# Altium footprint library TranDangKhoa-LIB.PcbLib: 1435 footprints (part 76 of 90)
Each footprint in its own frame and in the unit in brackets; x right, y up, seen from the top. Pads: shape width x height; smd on the part's side, far side on the other; paste and mask are expansions set on the pad; w line width, h text height; cw(c..) or ccw(c..) is an arc to the next point about the centre after c.
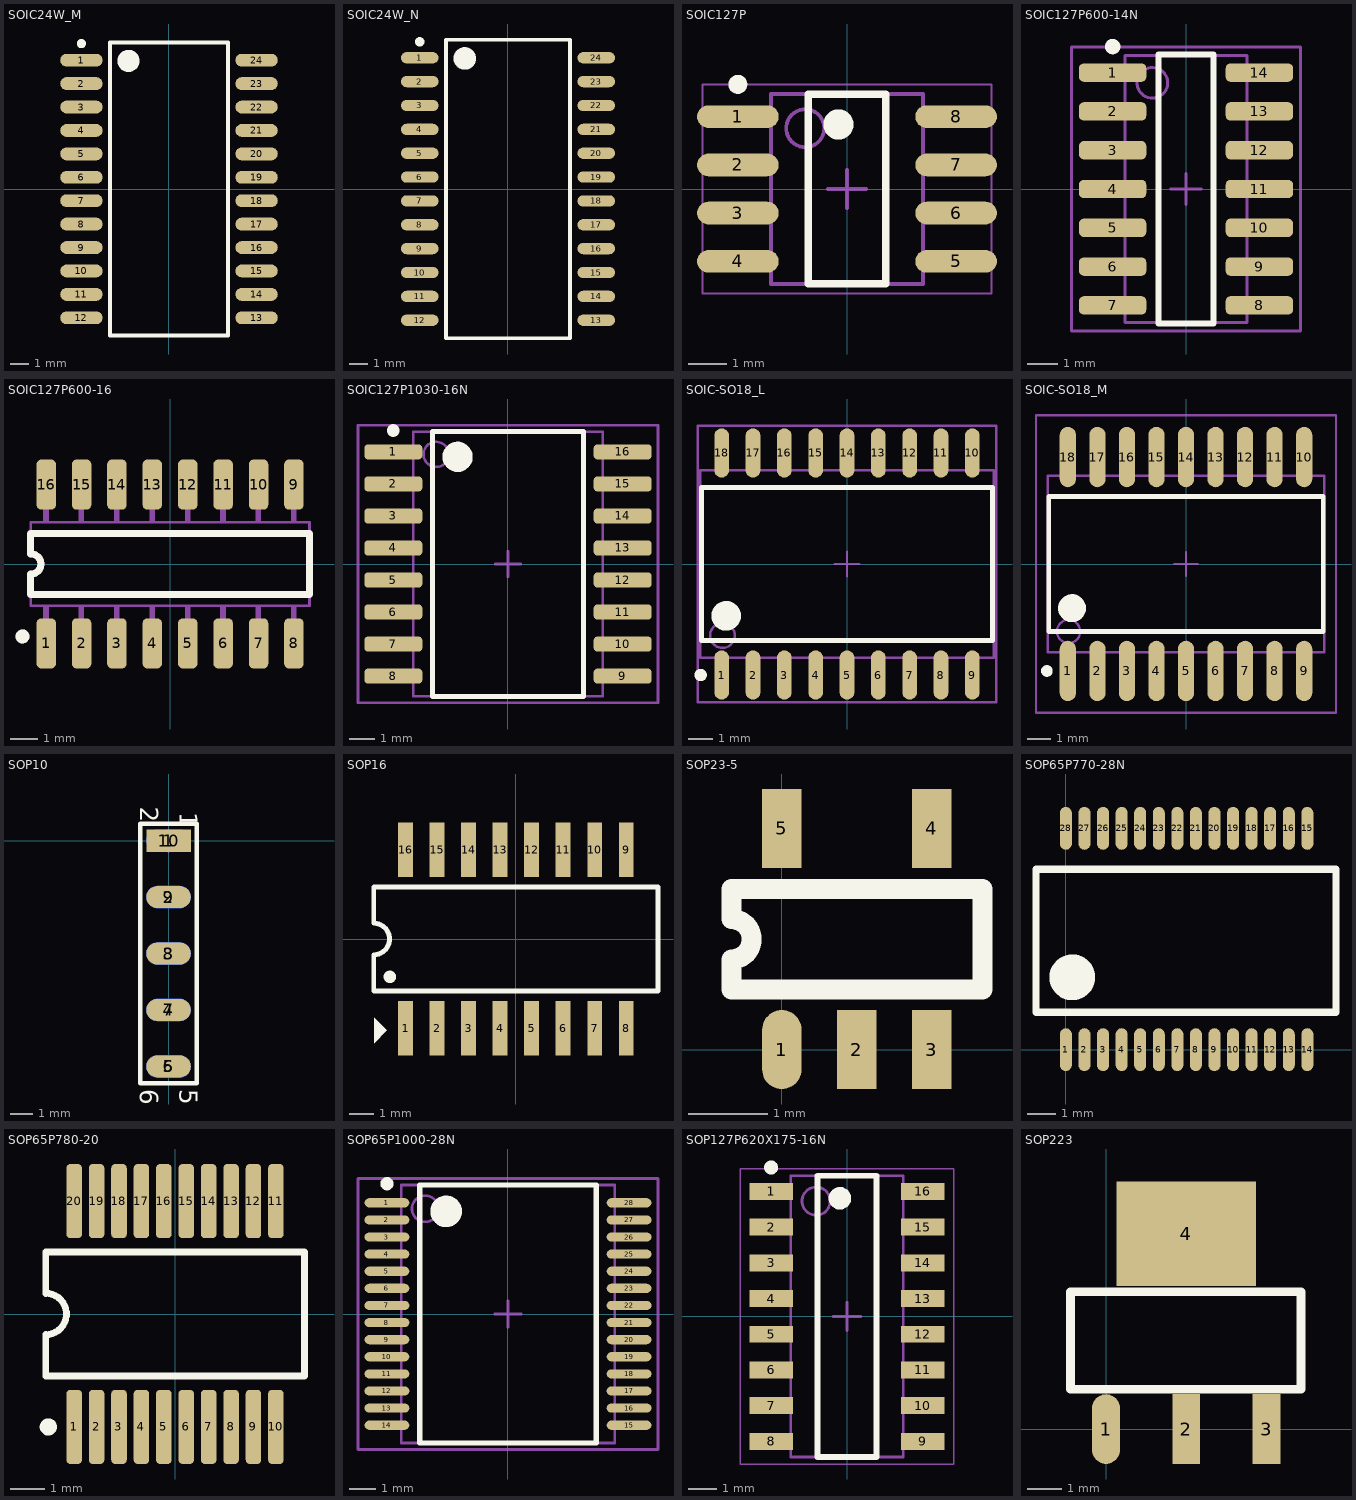
[diagram p75: the footprints below, top view; thin cyan lines are the x and y axes]

## SOIC24W_M [mm] "SOIC, 24-Leads, Body 15.4x7.5mm, Pitch 1.27mm, IPC Low Density"
height 2.67
pads (24):
  oval 2.3x0.7 smd: 1(-4.75,6.985) 2(-4.75,5.715) 3(-4.75,4.445) 4(-4.75,3.175) 5(-4.75,1.905) 6(-4.75,0.635) 7(-4.75,-0.635) 8(-4.75,-1.905) 9(-4.75,-3.175) 10(-4.75,-4.445) 11(-4.75,-5.715) 12(-4.75,-6.985) 13(4.75,-6.985) 14(4.75,-5.715) 15(4.75,-4.445) 16(4.75,-3.175) 17(4.75,-1.905) 18(4.75,-0.635) 19(4.75,0.635) 20(4.75,1.905) 21(4.75,3.175) 22(4.75,4.445) 23(4.75,5.715) 24(4.75,6.985)
Top Overlay:
  circle w0.6: c-2.2,6.95 r0.3
  circle w0.25: c-4.75,7.885 r0.125
  lines w0.2: -3.2,-7.95 3.2,-7.95 3.2,7.95 -3.2,7.95 -3.2,-7.95

## SOIC24W_N [mm] "SOIC, 24-Leads, Body 15.4x7.5mm, Pitch 1.27mm, IPC Medium Density"
height 2.67
pads (24):
  oval 2x0.6 smd: 1(-4.7,6.985) 2(-4.7,5.715) 3(-4.7,4.445) 4(-4.7,3.175) 5(-4.7,1.905) 6(-4.7,0.635) 7(-4.7,-0.635) 8(-4.7,-1.905) 9(-4.7,-3.175) 10(-4.7,-4.445) 11(-4.7,-5.715) 12(-4.7,-6.985) 13(4.7,-6.985) 14(4.7,-5.715) 15(4.7,-4.445) 16(4.7,-3.175) 17(4.7,-1.905) 18(4.7,-0.635) 19(4.7,0.635) 20(4.7,1.905) 21(4.7,3.175) 22(4.7,4.445) 23(4.7,5.715) 24(4.7,6.985)
Top Overlay:
  circle w0.25: c-4.7,7.835 r0.125
  circle w0.6: c-2.3,6.95 r0.3
  lines w0.2: -3.3,-7.95 -3.3,7.95 3.3,7.95 3.3,-7.95 -3.3,-7.95

## SOIC127P [mm] "SOIC, 8-Leads, Body 5.00x4.00mm, Pitch 1.27mm, IPC Medium Density"
height 1.7
pads (8):
  oval 2.15x0.6 smd: 1(-2.875,1.905) 2(-2.875,0.635) 3(-2.875,-0.635) 4(-2.875,-1.905) 5(2.875,-1.905) 6(2.875,-0.635) 7(2.875,0.635) 8(2.875,1.905)
Top Overlay:
  circle w0.4: c-0.225,1.7 r0.2
  circle w0.25: c-2.875,2.755 r0.125
  lines w0.2: -1.025,-2.5 1.025,-2.5 1.025,2.5 -1.025,2.5 -1.025,-2.5
Mechanical 13:
  circle w0.1: c-1.1,1.6 r0.5
  lines w0.1: -2,-2.5 2,-2.5 2,2.5 -2,2.5 -2,-2.5
Mechanical 15:
  lines w0.05: -3.8,-2.75 3.8,-2.75 3.8,2.75 -3.8,2.75 -3.8,-2.75
  lines w0.1: -0.5,0 0.5,0 ; 0,-0.5 0,0.5
3D body: height 1.7, standoff 1.7, extent -2,-2.5 2,2.5

## SOIC127P600-14N [mm]
pads (14):
  rrect50% 2.2x0.6 smd: 1(-2.4,3.81) 2(-2.4,2.54) 3(-2.4,1.27) 4(-2.4,0) 5(-2.4,-1.27) 6(-2.4,-2.54) 7(-2.4,-3.81) 8(2.4,-3.81) 9(2.4,-2.54) 10(2.4,-1.27) 11(2.4,0) 12(2.4,1.27) 13(2.4,2.54) 14(2.4,3.81)
Top Overlay:
  circle w0.25: c-2.4,4.66 r0.125
  lines w0.2: -0.9,-4.4 -0.9,4.4 0.9,4.4 0.9,-4.4 -0.9,-4.4
Mechanical 13:
  circle w0.1: c-1.1,3.475 r0.5
  lines w0.1: -2,-4.375 -2,4.375 2,4.375 2,-4.375 -2,-4.375
Mechanical 15:
  lines w0.1: -0.5,0 0.5,0 ; 0,-0.5 0,0.5 ; -3.75,-4.65 -3.75,4.65 3.75,4.65 3.75,-4.65 -3.75,-4.65
3D body "SW3dPS-SOIC14-150.STEP": height 1.75, standoff 0, extent -2.879,-4.275 2.921,4.275

## SOIC127P600-16 [mm]
pads (16):
  rrect50% 0.7x1.8 smd: 1(-4.445,-2.85) 2(-3.175,-2.85) 3(-1.905,-2.85) 4(-0.635,-2.85) 5(0.635,-2.85) 6(1.905,-2.85) 7(3.175,-2.85) 8(4.445,-2.85) 9(4.445,2.85) 10(3.175,2.85) 11(1.905,2.85) 12(0.635,2.85) 13(-0.635,2.85) 14(-1.905,2.85) 15(-3.175,2.85) 16(-4.445,2.85)
Top Overlay:
  circle w0.25: c-5.295,-2.6 r0.125
  lines w0.254: -5,-1.1 5,-1.1 5,1.1 -5,1.1 -5,0.367 cw(c-5,0) -5,-0.367 -5,-1.1
Mechanical 7:
  circle w0.25: c-5.295,-2.6 r0.125
  region: 4.34,-1.5 4.34,-2.8 4.54,-2.8 4.54,-1.5
  region: 3.07,-1.5 3.07,-2.8 3.27,-2.8 3.27,-1.5
  region: 1.8,-1.5 1.8,-2.8 2,-2.8 2,-1.5
  region: 0.53,-1.5 0.53,-2.8 0.73,-2.8 0.73,-1.5
  region: -0.74,-1.5 -0.74,-2.8 -0.54,-2.8 -0.54,-1.5
  region: -2.01,-1.5 -2.01,-2.8 -1.81,-2.8 -1.81,-1.5
  region: -3.28,-1.5 -3.28,-2.8 -3.08,-2.8 -3.08,-1.5
  region: -4.55,-1.5 -4.55,-2.8 -4.35,-2.8 -4.35,-1.5
  region: 4.54,1.5 4.54,2.8 4.34,2.8 4.34,1.5
  region: 3.27,1.5 3.27,2.8 3.07,2.8 3.07,1.5
  region: 2,1.5 2,2.8 1.8,2.8 1.8,1.5
  region: 0.73,1.5 0.73,2.8 0.53,2.8 0.53,1.5
  region: -0.54,1.5 -0.54,2.8 -0.74,2.8 -0.74,1.5
  region: -1.81,1.5 -1.81,2.8 -2.01,2.8 -2.01,1.5
  region: -3.08,1.5 -3.08,2.8 -3.28,2.8 -3.28,1.5
  region: -4.35,1.5 -4.35,2.8 -4.55,2.8 -4.55,1.5
  lines w0.1: -5,-0.367 -5,-1.5 5,-1.5 5,1.5 -5,1.5 -5,0.367
  lines w0.254: -5,-0.367 ccw(c-5,0) -5,0.367
  text ".Comment" at -4.8,-1.3 h0.8
  text ".Designator" at -4.8,0.8 h0.8
3D body "SW3dPS-SOIC16-150.STEP": height 1.75, standoff 0, extent -4.9,-2.875 4.9,2.925

## SOIC127P1030-16N [mm]
pads (16):
  rrect50% 2.3x0.6 smd: 1(-4.55,4.445) 2(-4.55,3.175) 3(-4.55,1.905) 4(-4.55,0.635) 5(-4.55,-0.635) 6(-4.55,-1.905) 7(-4.55,-3.175) 8(-4.55,-4.445) 9(4.55,-4.445) 10(4.55,-3.175) 11(4.55,-1.905) 12(4.55,-0.635) 13(4.55,0.635) 14(4.55,1.905) 15(4.55,3.175) 16(4.55,4.445)
Top Overlay:
  circle w0.6: c-2,4.25 r0.3
  circle w0.25: c-4.55,5.295 r0.125
  lines w0.2: -3,-5.25 3,-5.25 3,5.25 -3,5.25 -3,-5.25
Mechanical 13:
  circle w0.1: c-2.85,4.35 r0.5
  lines w0.1: -3.75,-5.25 3.75,-5.25 3.75,5.25 -3.75,5.25 -3.75,-5.25
Mechanical 15:
  lines w0.1: -0.5,0 0.5,0 ; 0,-0.5 0,0.5 ; -5.95,-5.5 5.95,-5.5 5.95,5.5 -5.95,5.5 -5.95,-5.5
3D body: height 0.2, standoff 0, extent 2.978,-0.905 4.851,-0.296
3D body: height 0.2, standoff 0, extent 2.959,-2.182 4.851,-1.573
3D body: height 0.2, standoff 0, extent 2.998,-3.477 4.851,-2.868
3D body: height 0.2, standoff 0, extent 3.025,-4.734 4.895,-4.164
3D body: height 0.2, standoff 0, extent 2.934,4.172 4.807,4.781
3D body: height 0.2, standoff 0, extent 2.915,2.895 4.807,3.504
3D body: height 0.2, standoff 0, extent 2.954,1.6 4.807,2.209
3D body: height 0.2, standoff 0, extent 2.981,0.343 4.851,0.913
3D body: height 0.2, standoff 0, extent -4.859,0.305 -2.987,0.914
3D body: height 0.2, standoff 0, extent -4.859,1.582 -2.968,2.191
3D body: height 0.2, standoff 0, extent -4.859,2.877 -3.007,3.486
3D body: height 0.2, standoff 0, extent -4.903,4.173 -3.034,4.743
3D body: height 0.2, standoff 0, extent -4.851,-0.917 -2.982,-0.347
3D body: height 0.2, standoff 0, extent -4.807,-2.213 -2.955,-1.604
3D body: height 0.2, standoff 0, extent -4.807,-3.508 -2.916,-2.899
3D body: height 0.2, standoff 0, extent -4.807,-4.785 -2.935,-4.176
3D body: height 2.65, standoff 0, extent -3.75,-5.25 3.75,5.25

## SOIC-SO18_L [mm] "SOIC, 18-Leads, Body 11.5x7.5mm, Pitch 1.27mm, IPC High Density"
height 2.65
pads (18):
  oval 0.6x2 smd: 1(-5.08,-4.5) 2(-3.81,-4.5) 3(-2.54,-4.5) 4(-1.27,-4.5) 5(0,-4.5) 6(1.27,-4.5) 7(2.54,-4.5) 8(3.81,-4.5) 9(5.08,-4.5) 10(5.08,4.5) 11(3.81,4.5) 12(2.54,4.5) 13(1.27,4.5) 14(0,4.5) 15(-1.27,4.5) 16(-2.54,4.5) 17(-3.81,4.5) 18(-5.08,4.5)
Top Overlay:
  circle w0.25: c-5.93,-4.5 r0.125
  circle w0.6: c-4.9,-2.1 r0.3
  lines w0.2: -5.9,-3.1 5.9,-3.1 5.9,3.1 -5.9,3.1 -5.9,-3.1
Mechanical 13:
  circle w0.1: c-5.05,-2.9 r0.5
  lines w0.1: -5.95,-3.8 5.95,-3.8 5.95,3.8 -5.95,3.8 -5.95,-3.8
Mechanical 15:
  lines w0.1: -0.5,0 0.5,0 ; 0,-0.5 0,0.5 ; -6.05,-5.6 6.05,-5.6 6.05,5.6 -6.05,5.6 -6.05,-5.6
3D body "PIC16F819-I-SOIC18.step": height 2.52, standoff 0.01, extent -5.765,-5.133 5.765,5.207

## SOIC-SO18_M [mm] "SOIC, 18-Leads, Body 11.5x7.5mm, Pitch 1.27mm, IPC Low Density"
height 2.65
pads (18):
  oval 0.7x2.6 smd: 1(-5.08,-4.6) 2(-3.81,-4.6) 3(-2.54,-4.6) 4(-1.27,-4.6) 5(0,-4.6) 6(1.27,-4.6) 7(2.54,-4.6) 8(3.81,-4.6) 9(5.08,-4.6) 10(5.08,4.6) 11(3.81,4.6) 12(2.54,4.6) 13(1.27,4.6) 14(0,4.6) 15(-1.27,4.6) 16(-2.54,4.6) 17(-3.81,4.6) 18(-5.08,4.6)
Top Overlay:
  circle w0.25: c-5.98,-4.6 r0.125
  circle w0.6: c-4.9,-1.9 r0.3
  lines w0.2: -5.9,-2.9 5.9,-2.9 5.9,2.9 -5.9,2.9 -5.9,-2.9
Mechanical 13:
  circle w0.1: c-5.05,-2.9 r0.5
  lines w0.1: -5.95,-3.8 5.95,-3.8 5.95,3.8 -5.95,3.8 -5.95,-3.8
Mechanical 15:
  lines w0.1: -0.5,0 0.5,0 ; 0,-0.5 0,0.5 ; -6.45,-6.4 6.45,-6.4 6.45,6.4 -6.45,6.4 -6.45,-6.4
3D body "PIC16F819-I-SOIC18.step": height 2.52, standoff 0.01, extent -5.765,-5.133 5.765,5.207

## SOP10 [mm] "SOIC 10 hai lop"
height 2.54
pads (10):
  rect 2x1 smd: 1(0,0)
  oval 2x1 smd: 2(0,-2.54) 3(0,-5.08) 4(0,-7.62) 5(0,-10.16)
  oval 2x1 smd far side: 6(0,-10.16) 7(0,-7.62) 8(0,-5.08) 9(0,-2.54) 10(0,0)
Top Overlay:
  lines w0.2: -1.27,0 -1.27,0.762 1.27,0.762 1.27,0 ; -1.27,0.086 -1.27,-10.414 -1.27,-10.922 1.27,-10.922 1.27,-10.414 1.27,0.086
  text "6" at -1.27,-11.176 h0.8
  text "5" at 0.508,-11.176 h0.8
  text "2" at -1.27,1.524 h0.8
  text "1" at 0.508,1.27 h0.8
Mechanical 15:
  lines w0.1: -0.5,0 0.5,0 ; 0,-0.5 0,0.5

## SOP16 [mm] "Small Outline; 16 Leads; Body Width 5.6 mm; Pitch 1.27 mm"
height 2
pads (16):
  rect 0.6x2.2 smd: 1(-4.445,-3.6) 2(-3.175,-3.6) 3(-1.905,-3.6) 4(-0.635,-3.6) 5(0.635,-3.6) 6(1.905,-3.6) 7(3.175,-3.6) 8(4.445,-3.6) 9(4.445,3.6) 10(3.175,3.6) 11(1.905,3.6) 12(0.635,3.6) 13(-0.635,3.6) 14(-1.905,3.6) 15(-3.175,3.6) 16(-4.445,3.6)
Top Overlay:
  circle w0.25: c-5.078,-1.524 r0.125
  region: -5.715,-4.191 -5.207,-3.683 -5.715,-3.175
  lines w0.2: -5.725,-2.1 -5.725,-0.635 ccw(c-5.725,0) -5.725,0.635 -5.725,2.1 5.725,2.1 5.725,-2.1 -5.725,-2.1

## SOP23-5 [mm]
pads (5):
  oval 0.5x1 smd: 1(0,0)
  rect 0.5x1 smd: 2(0.95,0) 3(1.9,0) 4(1.9,2.8) 5(0,2.8)
Top Overlay:
  lines w0.254: -0.635,0.762 2.54,0.762 2.54,2.032 -0.635,2.032 -0.635,1.651 cw(c-0.635,1.397) -0.635,1.143 -0.635,0.762

## SOP65P770-28N [mil]
pads (28):
  oval 16.53x59.03 smd mask+7.9: 1(0,0) 2(25.6,0) 3(51.18,0) 4(76.78,0) 5(102.37,0) 6(127.97,0) 7(153.57,0) 8(179.15,0) 9(204.75,0) 10(230.35,0) 11(255.93,0) 12(281.53,0) 13(307.12,0) 14(332.7,0) 15(332.7,305) 16(307.12,305) 17(281.53,305) 18(255.93,305) 19(230.35,305) 20(204.75,305) 21(179.15,305) 22(153.57,305) 23(127.97,305) 24(102.37,305) 25(76.78,305) 26(51.18,305) 27(25.6,305) 28(0,305)
Top Overlay:
  circle w39.37: c8.8,99.7 r11.88
  lines w10: -41.22,51.66 -41.22,248.53 372.21,248.53 372.21,51.66 -41.22,51.66
3D body "SOP65P770x200-28N.step": height 84.65, standoff 0, extent -37.01,0.01 369.69,305.35

## SOP65P780-20 [mm]
pads (20):
  rrect50% 0.45x2.15 smd: 1(-2.925,-3.275) 2(-2.275,-3.275) 3(-1.625,-3.275) 4(-0.975,-3.275) 5(-0.325,-3.275) 6(0.325,-3.275) 7(0.975,-3.275) 8(1.625,-3.275) 9(2.275,-3.275) 10(2.925,-3.275) 11(2.925,3.275) 12(2.275,3.275) 13(1.625,3.275) 14(0.975,3.275) 15(0.325,3.275) 16(-0.325,3.275) 17(-0.975,3.275) 18(-1.625,3.275) 19(-2.275,3.275) 20(-2.925,3.275)
Top Overlay:
  circle w0.25: c-3.675,-3.275 r0.125
  lines w0.2: -3.75,-1.8 -3.75,-0.6 ccw(c-3.75,0) -3.75,0.6 -3.75,1.8 3.75,1.8 3.75,-1.8 -3.75,-1.8
3D body: height 1, standoff 0, extent -3.278,-1.757 3.378,1.807
3D body: height 0.25, standoff 0.13, extent 2.849,1.894 3.027,2.631
3D body: height 0.13, standoff 0, extent 2.849,2.567 3.027,3.253
3D body: height 0.25, standoff 0.13, extent 2.189,1.919 2.367,2.656
3D body: height 0.13, standoff 0, extent 2.189,2.592 2.367,3.278
3D body: height 0.13, standoff 0, extent 2.85,-3.326 3.028,-2.641
3D body: height 0.25, standoff 0.13, extent 2.85,-2.679 3.028,-1.942
3D body: height 0.13, standoff 0, extent 2.215,-3.301 2.393,-2.615
3D body: height 0.25, standoff 0.13, extent 2.215,-2.679 2.393,-1.942
3D body: height 0.25, standoff 0.13, extent 1.478,1.843 1.656,2.58
3D body: height 0.13, standoff 0, extent 1.478,2.516 1.656,3.202
3D body: height 0.25, standoff 0.13, extent 0.843,1.843 1.021,2.58
3D body: height 0.13, standoff 0, extent 0.843,2.542 1.021,3.227
3D body: height 0.25, standoff 0.13, extent 0.182,1.869 0.36,2.605
3D body: height 0.13, standoff 0, extent 0.182,2.542 0.36,3.227
3D body: height 0.25, standoff 0.13, extent -0.478,1.894 -0.3,2.631
3D body: height 0.13, standoff 0, extent -0.478,2.567 -0.3,3.253
3D body: height 0.13, standoff 0, extent 1.529,-3.25 1.707,-2.564
3D body: height 0.25, standoff 0.13, extent 1.529,-2.628 1.707,-1.891
3D body: height 0.13, standoff 0, extent 0.869,-3.225 1.047,-2.539
3D body: height 0.25, standoff 0.13, extent 0.869,-2.602 1.047,-1.866
3D body: height 0.13, standoff 0, extent 0.209,-3.225 0.386,-2.539
3D body: height 0.25, standoff 0.13, extent 0.209,-2.577 0.386,-1.84
3D body: height 0.13, standoff 0, extent -0.426,-3.199 -0.249,-2.514
3D body: height 0.25, standoff 0.13, extent -0.426,-2.577 -0.249,-1.84
3D body: height 0.25, standoff 0.13, extent -2.966,-2.577 -2.789,-1.84
3D body: height 0.13, standoff 0, extent -2.966,-3.199 -2.789,-2.514
3D body: height 0.25, standoff 0.13, extent -2.331,-2.577 -2.154,-1.84
3D body: height 0.13, standoff 0, extent -2.331,-3.225 -2.154,-2.539
3D body: height 0.25, standoff 0.13, extent -1.671,-2.602 -1.493,-1.866
3D body: height 0.13, standoff 0, extent -1.671,-3.225 -1.493,-2.539
3D body: height 0.25, standoff 0.13, extent -1.011,-2.628 -0.833,-1.891
3D body: height 0.13, standoff 0, extent -1.011,-3.25 -0.833,-2.564
3D body: height 0.13, standoff 0, extent -3.018,2.567 -2.84,3.253
3D body: height 0.25, standoff 0.13, extent -3.018,1.894 -2.84,2.631
3D body: height 0.13, standoff 0, extent -2.358,2.542 -2.18,3.227
3D body: height 0.25, standoff 0.13, extent -2.358,1.869 -2.18,2.605
3D body: height 0.13, standoff 0, extent -1.697,2.542 -1.519,3.227
3D body: height 0.25, standoff 0.13, extent -1.697,1.843 -1.519,2.58
3D body: height 0.13, standoff 0, extent -1.062,2.516 -0.884,3.202
3D body: height 0.25, standoff 0.13, extent -1.062,1.843 -0.884,2.58
3D body: height 0.9, standoff 0, extent -3.327,-2.008 3.429,2.007

## SOP65P1000-28N [mm] "SOP, 28-Leads, Body 9.7x8mm, Pitch 0.65mm, IPC Medium Density"
height 2
pads (28):
  oval 1.7x0.35 smd: 1(-4.6,4.225) 2(-4.6,3.575) 3(-4.6,2.925) 4(-4.6,2.275) 5(-4.6,1.625) 6(-4.6,0.975) 7(-4.6,0.325) 8(-4.6,-0.325) 9(-4.6,-0.975) 10(-4.6,-1.625) 11(-4.6,-2.275) 12(-4.6,-2.925) 13(-4.6,-3.575) 14(-4.6,-4.225) 15(4.6,-4.225) 16(4.6,-3.575) 17(4.6,-2.925) 18(4.6,-2.275) 19(4.6,-1.625) 20(4.6,-0.975) 21(4.6,-0.325) 22(4.6,0.325) 23(4.6,0.975) 24(4.6,1.625) 25(4.6,2.275) 26(4.6,2.925) 27(4.6,3.575) 28(4.6,4.225)
Top Overlay:
  circle w0.6: c-2.35,3.9 r0.3
  circle w0.25: c-4.6,4.95 r0.125
  lines w0.2: -3.35,-4.9 3.35,-4.9 3.35,4.9 -3.35,4.9 -3.35,-4.9
Mechanical 13:
  circle w0.1: c-3.15,4 r0.5
  lines w0.1: -4.05,-4.9 4.05,-4.9 4.05,4.9 -4.05,4.9 -4.05,-4.9
Mechanical 15:
  lines w0.1: -0.5,0 0.5,0 ; 0,-0.5 0,0.5 ; -5.7,-5.15 5.7,-5.15 5.7,5.15 -5.7,5.15 -5.7,-5.15
3D body: height 2, standoff 0, extent -4.05,-4.9 4.05,4.9

## SOP127P620X175-16N [mm] "SOP, 16-Leads, Body 10.00x4.00mm, Pitch 1.27mm, IPC Medium Density"
height 1.75
pads (16):
  rect 1.55x0.6 smd: 1(-2.7,4.445) 2(-2.7,3.175) 3(-2.7,1.905) 4(-2.7,0.635) 5(-2.7,-0.635) 6(-2.7,-1.905) 7(-2.7,-3.175) 8(-2.7,-4.445) 9(2.7,-4.445) 10(2.7,-3.175) 11(2.7,-1.905) 12(2.7,-0.635) 13(2.7,0.635) 14(2.7,1.905) 15(2.7,3.175) 16(2.7,4.445)
Top Overlay:
  circle w0.4: c-0.25,4.2 r0.2
  circle w0.25: c-2.7,5.295 r0.125
  lines w0.2: -1.05,-5 1.05,-5 1.05,5 -1.05,5 -1.05,-5
Mechanical 13:
  circle w0.1: c-1.1,4.1 r0.5
  lines w0.1: -2,-5 2,-5 2,5 -2,5 -2,-5
Mechanical 15:
  lines w0.05: -3.8,-5.25 3.8,-5.25 3.8,5.25 -3.8,5.25 -3.8,-5.25
  lines w0.1: -0.5,0 0.5,0 ; 0,-0.5 0,0.5
3D body: height 1.75, standoff 0.25, extent -2,-5 2,5

## SOP223 [mm]
pads (4):
  oval 0.8x2 smd: 1(0,0)
  rect 0.8x2 smd: 2(2.3,0) 3(4.6,0)
  rect 4x3 smd: 4(2.3,5.6)
Top Overlay:
  lines w0.254: -1.016,1.143 -1.016,3.937 5.588,3.937 5.588,1.143 -1.016,1.143